# Altium footprint library General.PCBLIB: 231 footprints (part 9 of 15)
Each footprint in its own frame and in the unit in brackets; x right, y up, seen from the top. Pads: shape width x height; smd on the part's side, far side on the other; paste and mask are expansions set on the pad; w line width, h text height; cw(c..) or ccw(c..) is an arc to the next point about the centre after c.
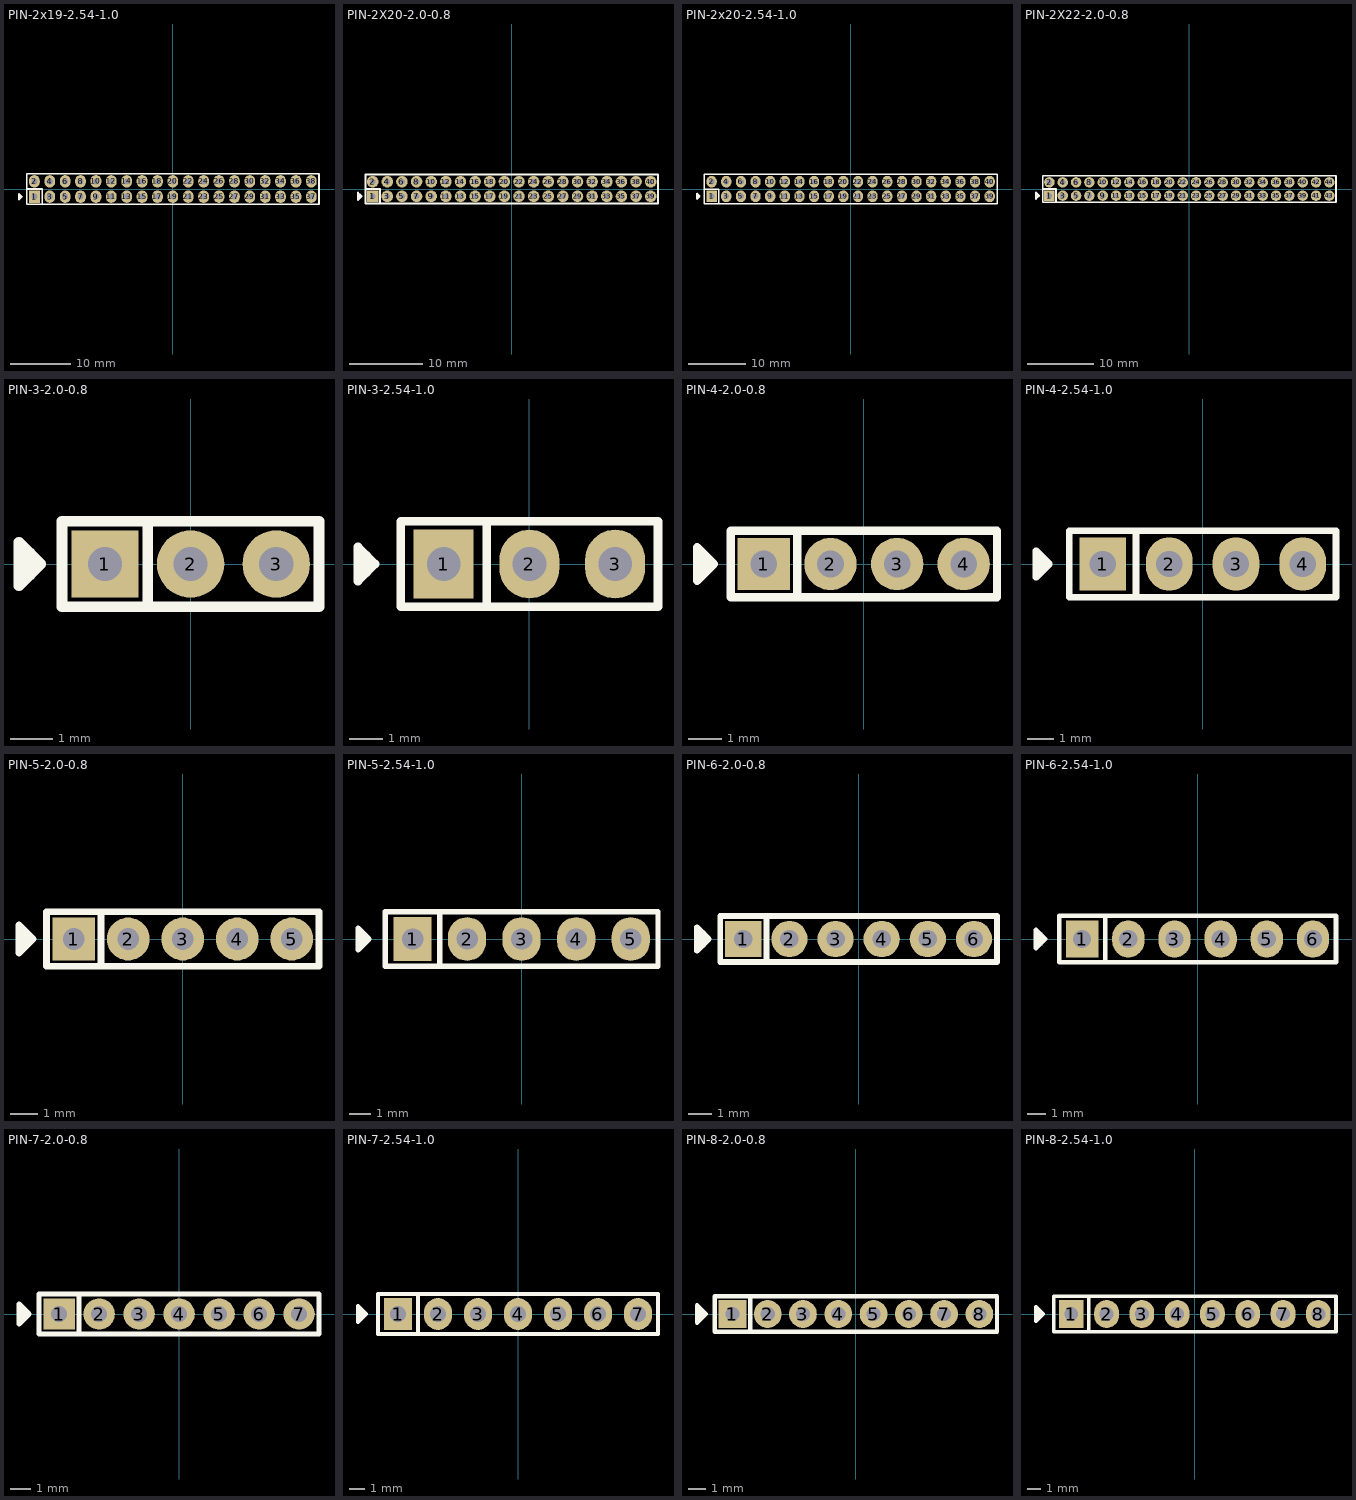
[diagram p8: the footprints below, top view; thin cyan lines are the x and y axes]

## PIN-2x19-2.54-1.0 [mil] "Pin Header"
height 374.02
pads (38):
  rect 70x80 hole 39.37: 1(-900,-50)
  oval 70x80 hole 39.37: 2(-900,50) 3(-800,-50) 4(-800,50) 5(-700,-50) 6(-700,50) 7(-600,-50) 8(-600,50) 9(-500,-50) 10(-500,50) 11(-400,-50) 12(-400,50) 13(-300,-50) 14(-300,50) 15(-200,-50) 16(-200,50) 17(-100,-50) 18(-100,50) 19(0,-50) 20(0,50) 21(100,-50) 22(100,50) 23(200,-50) 24(200,50) 25(300,-50) 26(300,50) 27(400,-50) 28(400,50) 29(500,-50) 30(500,50) 31(600,-50) 32(600,50) 33(700,-50) 34(700,50) 35(800,-50) 36(800,50) 37(900,-50) 38(900,50)
Top Overlay:
  lines w10: -990,-60 -990,-40 ; -950,0 -850,0 -850,-100 ; -1000,-70 -1000,-30 -980,-50 -1000,-70 ; -950,-100 950,-100 950,100 -950,100 -950,-100
3D body "PIN2X19_100mils.STEP": height 397.64, standoff -59.06, extent -950,-100 950,100

## PIN-2X20-2.0-0.8 [mm] "Pin Header"
height 3.8
pads (40):
  rect 1.575x1.575 hole 0.8: 1(-19,-1)
  round 1.575 hole 0.8: 2(-19,1) 3(-17,-1) 4(-17,1) 5(-15,-1) 6(-15,1) 7(-13,-1) 8(-13,1) 9(-11,-1) 10(-11,1) 11(-9,-1) 12(-9,1) 13(-7,-1) 14(-7,1) 15(-5,-1) 16(-5,1) 17(-3,-1) 18(-3,1) 19(-1,-1) 20(-1,1) 21(1,-1) 22(1,1) 23(3,-1) 24(3,1) 25(5,-1) 26(5,1) 27(7,-1) 28(7,1) 29(9,-1) 30(9,1) 31(11,-1) 32(11,1) 33(13,-1) 34(13,1) 35(15,-1) 36(15,1) 37(17,-1) 38(17,1) 39(19,-1) 40(19,1)
Top Overlay:
  lines w0.254: -20.754,-1.254 -20.754,-0.746 ; -20,0 -18,0 -18,-2 ; -21.008,-1.508 -21.008,-0.492 -20.5,-1 -21.008,-1.508 ; -20,-2 20,-2 20,2 -20,2 -20,-2
3D body "Samtec-MTMM-120-02-G-D-150.STEP": height 5.31, standoff -1.17, extent -20,-2 19.98,1.998

## PIN-2x20-2.54-1.0 [mil] "Pin Header"
height 374.02
pads (40):
  rect 70x80 hole 39.37: 1(-950,-50)
  oval 70x80 hole 39.37: 2(-950,50) 3(-850,-50) 4(-850,50) 5(-750,-50) 6(-750,50) 7(-650,-50) 8(-650,50) 9(-550,-50) 10(-550,50) 11(-450,-50) 12(-450,50) 13(-350,-50) 14(-350,50) 15(-250,-50) 16(-250,50) 17(-150,-50) 18(-150,50) 19(-50,-50) 20(-50,50) 21(50,-50) 22(50,50) 23(150,-50) 24(150,50) 25(250,-50) 26(250,50) 27(350,-50) 28(350,50) 29(450,-50) 30(450,50) 31(550,-50) 32(550,50) 33(650,-50) 34(650,50) 35(750,-50) 36(750,50) 37(850,-50) 38(850,50) 39(950,-50) 40(950,50)
Top Overlay:
  lines w10: -1040,-60 -1040,-40 ; -1000,0 -900,0 -900,-100 ; -1050,-70 -1050,-30 -1030,-50 -1050,-70 ; -1000,-100 1000,-100 1000,100 -1000,100 -1000,-100
3D body "PIN2X20_100mils.STEP": height 397.64, standoff -59.06, extent -1000,-100 1000,100

## PIN-2X22-2.0-0.8 [mm] "Pin Header"
height 3.8
pads (44):
  rect 1.575x1.575 hole 0.8: 1(-21,-1)
  round 1.575 hole 0.8: 2(-21,1) 3(-19,-1) 4(-19,1) 5(-17,-1) 6(-17,1) 7(-15,-1) 8(-15,1) 9(-13,-1) 10(-13,1) 11(-11,-1) 12(-11,1) 13(-9,-1) 14(-9,1) 15(-7,-1) 16(-7,1) 17(-5,-1) 18(-5,1) 19(-3,-1) 20(-3,1) 21(-1,-1) 22(-1,1) 23(1,-1) 24(1,1) 25(3,-1) 26(3,1) 27(5,-1) 28(5,1) 29(7,-1) 30(7,1) 31(9,-1) 32(9,1) 33(11,-1) 34(11,1) 35(13,-1) 36(13,1) 37(15,-1) 38(15,1) 39(17,-1) 40(17,1) 41(19,-1) 42(19,1) 43(21,-1) 44(21,1)
Top Overlay:
  lines w0.254: -22.754,-1.254 -22.754,-0.746 ; -22,0 -20,0 -20,-2 ; -23.008,-1.508 -23.008,-0.492 -22.5,-1 -23.008,-1.508 ; -22,-2 22,-2 22,2 -22,2 -22,-2
3D body "Samtec-MTMM-122-02-G-D-150.STEP": height 5.31, standoff -1.17, extent -22,-2 21.978,1.998

## PIN-3-2.0-0.8 [mil] "Pin Header"
height 149.61
pads (3):
  rect 62x62 hole 31.5: 1(-78.74,0)
  round 62 hole 31.5: 2(0,0) 3(78.74,0)
Top Overlay:
  lines w10: -147.8,-10 -147.8,10 ; -39.37,-39.37 -39.37,39.37 ; -157.8,-20 -157.8,20 -137.8,0 -157.8,-20 ; -118.11,-39.37 118.11,-39.37 118.11,39.37 -118.11,39.37 -118.11,-39.37
3D body "Samtec-MTMM-103-02-G-S-150.STEP": height 209, standoff -46, extent -118.11,-39.37 117.99,39.33

## PIN-3-2.54-1.0 [mil] "Pin Header"
height 374.02
pads (3):
  rect 70x80 hole 39.37: 1(-100,0)
  oval 70x80 hole 39.37: 2(0,0) 3(100,0)
Top Overlay:
  lines w10: -190,-10 -190,10 ; -50,-50 -50,50 ; -200,-20 -200,20 -180,0 -200,-20 ; -150,-50 150,-50 150,50 -150,50 -150,-50
3D body "PIN3_100mils.STEP": height 397.64, standoff -59.06, extent -150,-50 150,50

## PIN-4-2.0-0.8 [mm] "Pin Header"
height 3.8
pads (4):
  rect 1.575x1.575 hole 0.8: 1(-3,0)
  round 1.575 hole 0.8: 2(-1,0) 3(1,0) 4(3,0)
Top Overlay:
  lines w0.254: -4.754,-0.254 -4.754,0.254 ; -2,-1 -2,1 ; -5.008,-0.508 -4.5,0 -5.008,0.508 -5.008,-0.508 ; -4,-1 -4,1 4,1 4,-1 -4,-1
3D body "Samtec-MTMM-104-02-G-S-150.STEP": height 5.31, standoff -1.17, extent -4,-1 3.996,0.999

## PIN-4-2.54-1.0 [mil] "Pin Header"
height 374.02
pads (4):
  rect 70x80 hole 39.37: 1(-150,0)
  oval 70x80 hole 39.37: 2(-50,0) 3(50,0) 4(150,0)
Top Overlay:
  lines w10: -240,-10 -240,10 ; -100,-50 -100,50 ; -250,-20 -250,20 -230,0 -250,-20 ; -200,-50 -200,50 200,50 200,-50 -200,-50
3D body "PIN4_100mils.STEP": height 397.64, standoff -59.06, extent -200,-50 200,50

## PIN-5-2.0-0.8 [mil] "Pin Header"
height 149.61
pads (5):
  rect 62x62 hole 31.5: 1(-157.48,0)
  round 62 hole 31.5: 2(-78.74,0) 3(0,0) 4(78.74,0) 5(157.48,0)
Top Overlay:
  lines w10: -226.54,-10 -226.54,10 ; -118.11,-39.37 -118.11,39.37 ; -236.54,-20 -236.54,20 -216.54,0 -236.54,-20 ; -196.85,-39.37 196.85,-39.37 196.85,39.37 -196.85,39.37 -196.85,-39.37
3D body "Samtec-MTMM-105-02-G-S-150.STEP": height 209, standoff -46, extent -196.85,-39.37 196.65,39.33

## PIN-5-2.54-1.0 [mil] "Pin Header"
height 374.02
pads (5):
  rect 70x80 hole 39.37: 1(-200,0)
  oval 70x80 hole 39.37: 2(-100,0) 3(0,0) 4(100,0) 5(200,0)
Top Overlay:
  lines w10: -290,-10 -290,10 ; -150,-50 -150,50 ; -300,-20 -280,0 -300,20 -300,-20 ; -250,-50 -250,50 250,50 250,-50 -250,-50
3D body "PIN5_100mils.STEP": height 397.64, standoff -59.06, extent -250,-50 250,50

## PIN-6-2.0-0.8 [mm] "Pin Header"
height 3.8
pads (6):
  rect 1.575x1.575 hole 0.8: 1(-5,0)
  round 1.575 hole 0.8: 2(-3,0) 3(-1,0) 4(1,0) 5(3,0) 6(5,0)
Top Overlay:
  lines w0.254: -6.754,-0.254 -6.754,0.254 ; -4,-1 -4,1 ; -7.008,-0.508 -7.008,0.508 -6.5,0 -7.008,-0.508 ; -6,-1 6,-1 6,1 -6,1 -6,-1
3D body "Samtec-MTMM-106-02-G-S-150.STEP": height 5.31, standoff -1.17, extent -6,-1 5.994,0.999

## PIN-6-2.54-1.0 [mil] "Pin Header"
height 374.02
pads (6):
  rect 70x80 hole 39.37: 1(-250,0)
  oval 70x80 hole 39.37: 2(-150,0) 3(-50,0) 4(50,0) 5(150,0) 6(250,0)
Top Overlay:
  lines w10: -340,-10 -340,10 ; -200,-50 -200,50 ; -350,-20 -330,0 -350,20 -350,-20 ; -300,-50 300,-50 300,50 -300,50 -300,-50
3D body "PIN6_100mils.STEP": height 397.64, standoff -59.06, extent -300,-50 300,50

## PIN-7-2.0-0.8 [mil] "Pin Header"
height 149.61
pads (7):
  rect 62x62 hole 31.5: 1(-236.22,0)
  round 62 hole 31.5: 2(-157.48,0) 3(-78.74,0) 4(0,0) 5(78.74,0) 6(157.48,0) 7(236.22,0)
Top Overlay:
  lines w10: -305.28,-10 -305.28,10 ; -196.85,-39.37 -196.85,39.37 ; -315.28,-20 -295.28,0 -315.28,20 -315.28,-20 ; -275.59,-39.37 -275.59,39.37 275.59,39.37 275.59,-39.37 -275.59,-39.37
3D body "Samtec-MTMM-107-02-G-S-150.STEP": height 209, standoff -46, extent -275.59,-39.37 275.31,39.33

## PIN-7-2.54-1.0 [mil] "Pin Header"
height 374.02
pads (7):
  rect 70x80 hole 39.37: 1(-300,0)
  oval 70x80 hole 39.37: 2(-200,0) 3(-100,0) 4(0,0) 5(100,0) 6(200,0) 7(300,0)
Top Overlay:
  lines w10: -390,-10 -390,10 ; -250,-50 -250,50 ; -400,-20 -380,0 -400,20 -400,-20 ; -350,-50 350,-50 350,50 -350,50 -350,-50
3D body "PIN7_100mils.STEP": height 397.64, standoff -59.06, extent -350,-50 350,50

## PIN-8-2.0-0.8 [mm] "Pin Header"
height 3.8
pads (8):
  rect 1.575x1.575 hole 0.8: 1(-7,0)
  round 1.575 hole 0.8: 2(-5,0) 3(-3,0) 4(-1,0) 5(1,0) 6(3,0) 7(5,0) 8(7,0)
Top Overlay:
  lines w0.254: -8.754,-0.254 -8.754,0.254 ; -6,-1 -6,1 ; -9.008,-0.508 -9.008,0.508 -8.5,0 -9.008,-0.508 ; -8,-1 8,-1 8,1 -8,1 -8,-1
3D body "Samtec-MTMM-108-02-G-S-150.STEP": height 5.31, standoff -1.17, extent -8,-1 7.992,0.999

## PIN-8-2.54-1.0 [mil] "Pin Header"
height 374.02
pads (8):
  rect 70x80 hole 39.37: 1(-350,0)
  oval 70x80 hole 39.37: 2(-250,0) 3(-150,0) 4(-50,0) 5(50,0) 6(150,0) 7(250,0) 8(350,0)
Top Overlay:
  lines w10: -440,-10 -440,10 ; -300,-50 -300,50 ; -450,-20 -450,20 -430,0 -450,-20 ; -400,-50 -400,50 400,50 400,-50 -400,-50
3D body "PIN8_100mils.STEP": height 397.64, standoff -59.06, extent -400,-50 400,50